# Altium footprint library common.PcbLib: 552 footprints (part 24 of 35)
Each footprint in its own frame and in the unit in brackets; x right, y up, seen from the top. Pads: shape width x height; smd on the part's side, far side on the other; paste and mask are expansions set on the pad; w line width, h text height; cw(c..) or ccw(c..) is an arc to the next point about the centre after c.
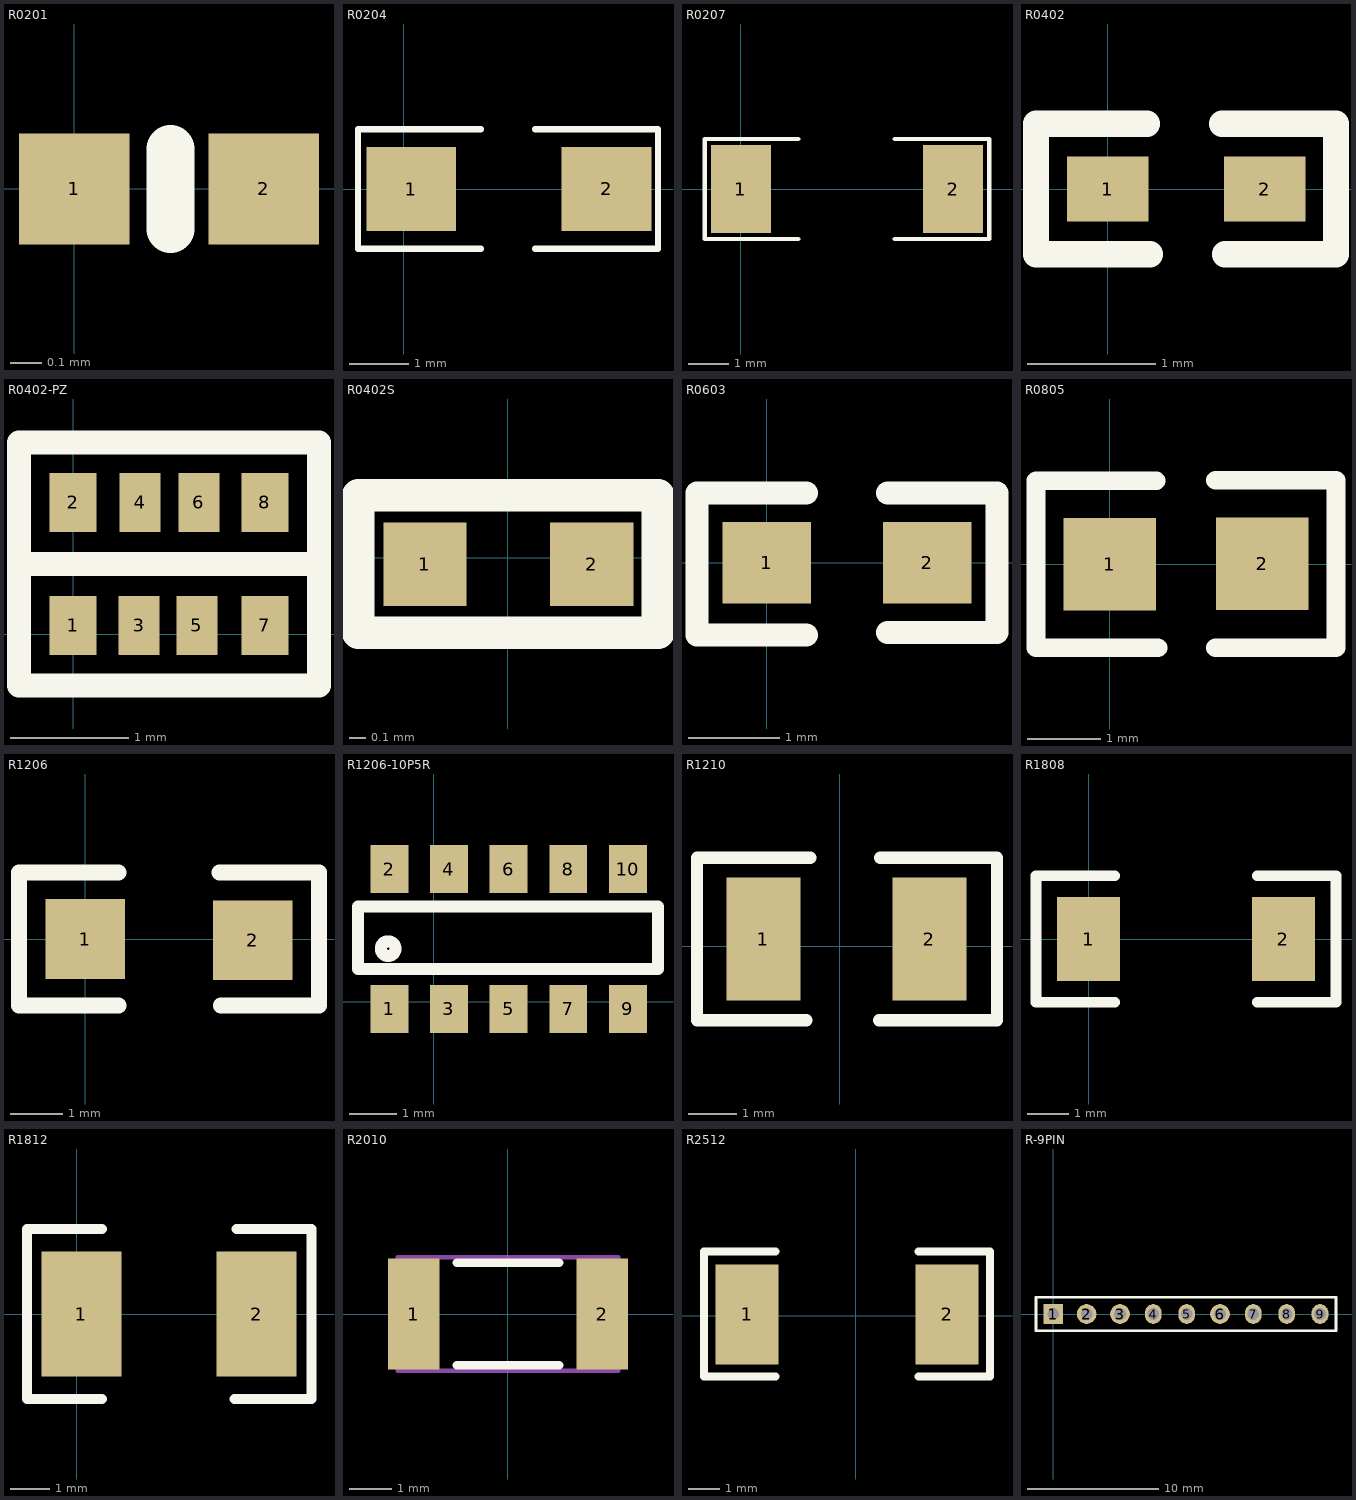
[diagram p23: the footprints below, top view; thin cyan lines are the x and y axes]

## R0201 [mm]
pads (2):
  rect 0.35x0.35 smd: 1(0,0) 2(0.6,0)
Top Overlay:
  lines w0.152: 0.305,-0.127 0.305,0.127
3D body: height 0.28, standoff -0.02, extent 0,-0.15 0.6,0.15

## R0204 [mm]
height 0.6
pads (2):
  rect 1.5x1.4 smd: 1(0.127,0) 2(3.4,0)
Top Overlay:
  lines w0.102: 1.3,-1 -0.762,-1 -0.762,1 1.3,1 ; 2.2,-1 4.262,-1 4.262,1 2.2,1
3D body: height 1.4, standoff 0, extent 0.078,-0.711 3.478,0.689

## R0207 [mm]
height 0.6
pads (2):
  rect 1.5x2.2 smd: 1(0,0) 2(5.3,0)
Top Overlay:
  lines w0.102: 1.431,-1.246 -0.906,-1.246 -0.906,1.252 1.431,1.252 ; 3.844,-1.246 6.206,-1.246 6.206,1.252 3.844,1.252
3D body: height 2.2, standoff 0, extent 0,-1.1 5.3,1.1

## R0402 [mil] "1/16W"
pads (2):
  rect 25x20 smd: 1(0,0) 2(48.2,0)
Top Overlay:
  lines w8: 12,20 -22,20 -22,-20 13,-20 ; 35,20 70,20 70,-20 36,-20
3D body: height 13.78, standoff 0, extent 4.71,-9.79 44.09,9.9

## R0402-PZ [mm] "1/16W"
pads (8):
  rect 0.4x0.5 smd: 1(0,0.076) 2(0,1.118) 7(1.626,0.076) 8(1.626,1.118)
  rect 0.35x0.5 smd: 3(0.559,0.076) 4(0.567,1.118) 5(1.05,0.076) 6(1.067,1.118)
Top Overlay:
  lines w0.2: -0.457,0.597 2.045,0.597
  lines w0.203: -0.457,-0.432 -0.457,1.626 2.083,1.626 2.083,-0.432 -0.457,-0.432
3D body: height 0.45, standoff 0, extent -0.187,0.11 1.813,1.11

## R0402S [mil] "1/16W"
pads (2):
  rect 20x20 smd: 1(-19.93,-1.58) 2(20.07,-1.58)
Top Overlay:
  lines w7.87: -36,-18 -36,15 36,15 36,-18 -36,-18
3D body: height 13.78, standoff 0, extent -19.59,-11.6 19.79,8.09

## R0603 [mil] "1/10W"
pads (2):
  rect 38x35 smd: 1(0,0) 2(69,0)
Top Overlay:
  lines w10: 17,-31 -30,-31 -30,30 17,30 ; 52,-30 99,-30 99,30 52,30
3D body: height 17.72, standoff 0, extent 3.51,-15.74 66.5,15.75

## R0805 [mm] "1/8W"
pads (2):
  rect 1.27x1.27 smd: 1(0,0) 2(2.09,0.005)
Top Overlay:
  lines w0.254: 0.635,1.143 -1.011,1.143 -1.011,-1.143 0.66,-1.143 ; 1.448,-1.143 3.099,-1.143 3.099,1.148 1.448,1.148
3D body: height 0.55, standoff 0, extent 0.036,-0.62 2.036,0.64

## R1206 [mil] "1/4W"
pads (2):
  rect 60x60 smd: 1(0,0) 2(126,-1)
Top Overlay:
  lines w12: 25,-50 -50,-50 -50,50 25,50 ; 101,50 176,50 176,-50 102,-50
3D body: height 23.62, standoff 0, extent 0.01,-32.49 126,30.5

## R1206-10P5R [mil]
pads (10):
  rect 31.5x40 smd: 1(-37,-6) 2(-37,110) 3(12.5,-6) 4(12.5,110) 5(62,-6) 6(62,110) 7(111.5,-6) 8(111.5,110) 9(161,-6) 10(161,110)
Top Overlay:
  circle w10: c-38,44 r6.08
  lines w10: -63,27 186,27 186,79 -63,79 -63,27
3D body: height 25.7, standoff 0.5, extent -63.98,-7.02 187.98,115.02

## R1210 [mil] "1/3W"
pads (2):
  rect 60x100 smd: 1(-62,6) 2(73,6)
Top Overlay:
  lines w10: -27,-60 -116,-60 -116,72 -24,72 ; 32,-60 128,-60 128,72 ; 33,72 126.8,72
3D body: height 67.1, standoff 0, extent -72.75,-44 84.75,54

## R1808 [mil]
pads (2):
  rect 60x80 smd: 1(0,0) 2(185,0)
Top Overlay:
  lines w10: 25,-60 -50,-60 -50,60 25,60 ; 160,-60 235,-60 235,60 160,60
3D body: height 39.37, standoff 0, extent 2,-39 179.77,37.49

## R1812 [mil] "1/2W"
pads (2):
  rect 80x125 smd: 1(4.39,-0.02) 2(180,-0.02)
Top Overlay:
  lines w10: 25,-85 -50,-85 -50,85 25,85 ; 158,-85 160,-85 235,-85 235,85 160,85 ; 159,-85 161,-85
3D body: height 63.07, standoff 0, extent 5.42,-62 182.58,63.98

## R2010 [mm] "3/4W"
height 0.9
pads (2):
  rect 1.2x2.6 smd: 1(-2.2,0) 2(2.2,0)
Top Overlay:
  lines w0.2: -1.2,-1.2 1.2,-1.2 ; -1.2,1.2 1.2,1.2
Mechanical 13:
  lines w0.1: -2.575,-1.325 -2.575,1.325 2.575,1.325 2.575,-1.325 -2.575,-1.325
3D body: height 0.57, standoff -0.05, extent -3,-1.35 3,1.35

## R2512 [mm] "1W"
height 0.9
pads (2):
  rect 2x3.2 smd: 1(-3.479,0.051) 2(2.921,0.051)
Top Overlay:
  lines w0.254: -2.565,-1.93 -4.851,-1.93 -4.851,2.057 -2.565,2.057 ; 2.007,-1.93 4.293,-1.93 4.293,2.057 2.007,2.057
3D body: height 0.6, standoff 0, extent -3.479,-1.549 2.921,1.651

## R-9PIN [mm]
pads (9):
  rect 1.5x1.5 hole 0.9: 1(0,0)
  round 1.5 hole 0.9: 2(2.54,0) 3(5.08,0) 6(12.7,0)
  oval 1.27x1.5 hole 0.9: 4(7.62,0) 5(10.16,0) 7(15.24,0) 8(17.78,0) 9(20.32,0)
Top Overlay:
  lines w0.2: -1.321,-1.27 -1.321,1.27 21.539,1.27 21.539,-1.27 -1.321,-1.27
3D body: height 5.3, standoff -3.2, extent -1.012,-0.635 21.488,0.615